# Altium schematic symbol library LATTICEPLDS_Library.SchLib: 291 symbols (part 8 of 32) (continued)
## LFE2-12/20-Q208/QN208 (continued)
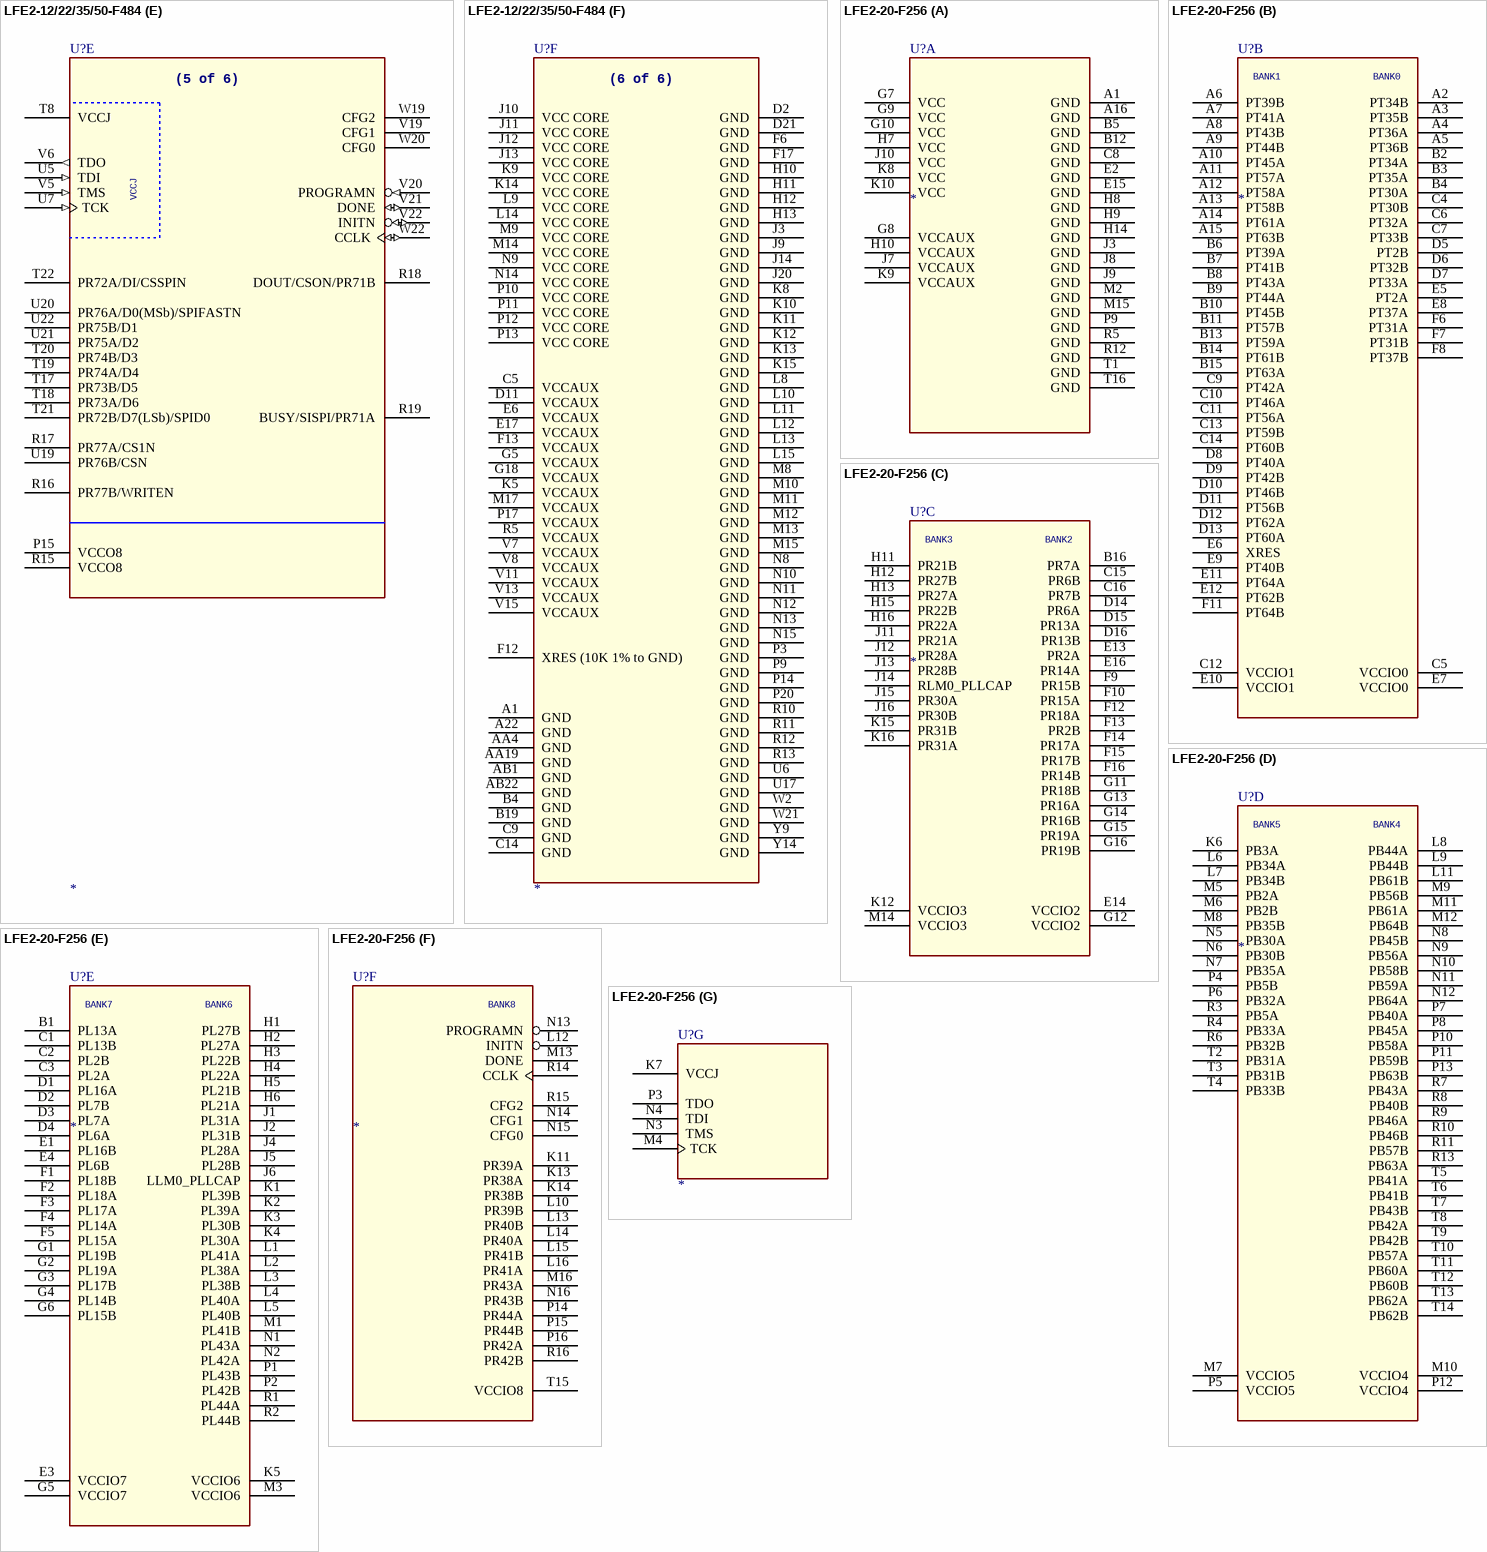
[diagram p80: symbols LFE2-12/22/35/50-F484 to LFE2-20-F256]
part A text: BANK 7; (1 OF 5); BANK 6; ** These dedicated input pins / can be used for GPLLs or GDLLs / within the respective quadrant.; Pad name = PL{LFE2-12/LFE2-20}
part B text: BANK 5; (2 OF 5); BANK 4; Pad name = PB{LFE2-12/LFE2-20}
part C text: BANK 3/8; (3 OF 5); BANK 2; ** These dedicated input pins / can be used for GPLLs or GDLLs / within the respective quadrant.; Pad name = PR{EC1/EC3/EC6}
part D text: BANK 1; (4 OF 5); BANK 0; Pad name = PT{LFE2-12/LFE2-20}
part E text: (5 OF 5); Bank 8

## LFE2-12/22/35/50-F484
designator U?
Data Sheet Rev: 1.0
footprint fpBGA484
part A pins: A2 PT12/21/21/30A, A3 PT12/21/21/30B, A4 PT13/22/22/31A, A5 PT13/22/22/31B, A6 PT21/30/30/39A, A7 PT24/33/33/42A, A8 PT24/33/33/42B, A9 PT27/36/36/45A, A10 PT27/36/36/45B, A11 PT31/40/40/49A, A12 PT31/40/40/49B, A13 PT35/44/44/53B, A14 PT39/48/48/57A, A15 PT40/49/49/58A, A16 PT44/53/53/62A, A17 PT44/53/53/62B, A18 PT49/58/67/76B, A19 PT52/61/70/79A, A20 PT50/59/68/77A, A21 PT50/59/68/77B, B1 PT5/5/5/5A, B2 PT5/5/5/5B, B3 PT10/10/10/10A, B5 PT16/25/25/34A, B6 PT16/25/25/34B, B7 PT21/30/30/39B, B8 PT23/32/32/41B, B9 PT23/32/32/41A, B10 PT28/37/37/46B/PCLKC0_0, B11 PT28/37/37/46A/PCLKT0_0, B12 PCLKC1_0/PT30/39/39/48B, B13 PT35/44/44/53A, B14 PT39/48/48/57B, B15 PT40/49/49/58B, B16 PT45/54/54/63A, B17 PT45/54/54/63B, B18 PT49/58/67/76A, B20 PT52/61/70/79B, B21 VREF2_1/PT55/64/73/82B, B22 VREF1_1/PT55/64/73/82A, C1 PT2/2/2/2A/VREF1_0, C2 PT3/3/3/3A, C3 PT10/10/10/10B, C4 PT6/6/6/6A, C6 PT17/26/26/35A, C7 PT17/26/26/35B, C8 PT20/29/29/38B, C10 PT26/35/35/44A, C11 PT26/35/35/44B, C12 PCLKT1_0/PT30/39/39/48A, C13 PT37/46/46/55A, C15 PT43/52/52/61B, C16 PT46/55/55/64A, C17 PT46/55/55/64B, C18 PT51/60/69/78A, C19 PT54/63/72/81A, C20 PT54/63/72/81B, D1 PT2/2/2/2B/VREF2_0, D3 PT3/3/3/3B, D4 PT6/6/6/6B, D5 PT7/7/7/7B, D6 PT7/7/7/7A, D7 PT9/9/9/9A, D8 PT20/29/29/38A, D9 PT15/24/24/33A, D10 PT18/27/27/36B, D12 PT33/42/42/51A, D13 PT34/43/43/52A, D14 PT37/46/46/55B, D15 PT43/52/52/61A, D16 PT47/56/65/74B, D17 PT51/60/69/78B, D18 PT53/62/71/80B, E7 PT8/8/8/8B, E8 PT11/20/20/29A, E9 PT14/23/23/32A, E10 PT18/27/27/36A, E11 PT25/34/34/43B, E12 PT33/42/42/51B, E13 PT34/43/43/52B, E14 PT36/45/45/54B, E15 PT42/51/51/60B, E16 PT47/56/65/74A, E18 PT53/62/71/80A, F7 PT8/8/8/8A, F8 PT9/9/9/9B, F9 PT14/23/23/32B, F10 PT15/24/24/33B, F11 PT25/34/34/43A, F14 PT36/45/45/54A, F15 PT42/51/51/60A, G8 PT11/20/20/29B, G9 VCCO0 (power), G10 VCCO0 (power), G11 VCCO1 (power), G12 VCCO1 (power), G13 VCCO1 (power), G14 VCCO1 (power), G15 PT48/57/66/75A, G16 PT48/57/66/75B, H7 PT4/4/4/4A, H8 VCCO0 (power), H9 VCCO0 (power), J7 PT4/4/4/4B
part B pins: C21 PRNC/4/10/12BH, C22 PRNC/4/10/12AH, D19 PR2/2/2/2BH/VREF2_2, D20 PR4/6/12/14AH, D22 PRNC/10/16/18BH, E19 PR2/2/2/2AH/VREF1_2, E20 PR4/6/12/14BH, E21 PRNC/10/16/18AH, E22 PRNC/11/17/19A, F16 PR3/5/11/13A, F18 PR3/5/11/13B, F19 PR5/7/13/15A, F20 PRNC/9/15/17A, F21 PRNC/11/17/19B, F22 PR9/15/21/40A, G17 PR5/7/13/15B, G19 PRNC/8/14/16AH/RDQS, G20 PRNC/9/15/17B, G21 PR6/12/18/37AH, G22 PR9/15/21/40B, H14 VCCO2 (power), H15 VCCO2 (power), H16 PRNC/NC/NC/26A/SPLLT_FB, H17 PRNC/NC/NC/26B/SPLLC_FB, H18 PRNC/NC/NC/25A/SPLLT_IN, H19 PRNC/8/14/16BH, H20 PRNC/NC/NC/25B/SPLLC_IN, H21 PR6/12/18/37BH, H22 PRNC/23/29/48AH, J15 VCCO2 (power), J16 PLLVCC (power), J17 PR8/14/20/39BH, J18 PR8/14/20/39AH, J19 PR7/13/19/38A, J21 PCLKT3_0/PR15/21/27/46AH, J22 PRNC/23/29/48BH, K16 VCCO2 (power), K17 PR11/17/23/42A, K18 PR10/16/22/41BH, K19 PR10/16/22/41AH/RDQS, K20 PR7/13/19/38B, K21 PCLKC3_0/PR15/21/27/46BH, K22 PRNC/24/30/49A, L16 VCCO3 (power), L17 PR13/19/25/44A/PCLKT2_0, L18 PR11/17/23/42B, L19 PR12/18/24/43BH, L20 PR12/18/24/43AH, L21 VREF1_3/PR16/22/28/47A, L22 PRNC/24/30/49B, M16 VCCO3 (power), M18 PR13/19/25/44B/PCLKC2_0, M19 PRNC/26/40/59A, M20 VREF2_3/PR16/22/28/47B, M21 GDLLT_IN/PR17/27/41/60AH, M22 GDLLC_IN/PR17/27/41/60BH, N16 VCCO3 (power), N17 PLLCAP (power), N18 PLLVCC (power), N19 PRNC/26/40/59B, N20 GDLLT_FB/PR18/28/42/61A, N21 GPLLT_IN/PR20/30/44/63AH, N22 GDLLC_FB/PR18/28/42/61B, P16 VCCO3 (power), P18 PR22/32/46/65BH, P19 PR22/32/46/65AH, P21 GPLLC_IN/PR20/30/44/63BH, P22 GPLLT_FB/PR21/31/45/64A, R20 GPLLC_FB/PR21/31/45/64B, R21 PR23/33/47/66A, R22 PR23/33/47/66B
part C pins: AA3 PB6/6/6/6B, AA5 PB8/8/8/8A, AA6 PB9/9/9/9B, AA7 PB13/22/22/31A, AA8 PB16/25/25/34B, AA9 PB18/27/27/36B, AA10 PB21/30/30/39B, AA11 PB23/32/32/41B, AA12 PB25/34/34/43B, AA13 BDQS/PB33/42/42/51A, AA14 PB35/44/44/53B, AA15 PB41/50/50/59B, AA16 BDQS/PB42/51/51/60A, AA17 PB42/51/51/60B, AA18 PB46/55/55/64A, AA20 PB46/55/55/64B, AA21 PB48/57/66/75A, AA22 PB48/57/66/75B, AB2 PB5/5/5/5B, AB3 PB5/5/5/5A, AB4 PB7/7/7/7B, AB5 PB7/7/7/7A, AB6 PB9/9/9/9A, AB7 PB13/22/22/31B, AB8 PB18/27/27/36A, AB9 PB20/29/29/38A, AB10 PB20/29/29/38B, AB11 PB23/32/32/41A, AB12 PB25/34/34/43A, AB13 PB26/35/35/44A/PCLKT5_0, AB14 PB26/35/35/44B/PCLKC5_0, AB15 PB35/44/44/53A, AB16 PB36/45/45/54A, AB17 PB36/45/45/54B, AB18 PB39/48/48/57A, AB19 PB39/48/48/57B, AB20 PB43/52/52/61A, AB21 PB43/52/52/61B, R9 VCCO5 (power), R14 VCCO4 (power), T9 VCCO5 (power), T10 VCCO5 (power), T11 VCCO5 (power), T12 VCCO4 (power), T13 VCCO4 (power), T14 VCCO4 (power), T15 VREF2_4/PB55/64/73/82A, T16 VREF1_4/PB55/64/73/82B, U8 PB14/23/23/32A, U9 PB14/23/23/32B, U10 PB22/31/31/40A, U11 PB22/31/31/40B, U12 PCLKT4_0/PB31/40/40/49A, U13 PB34/43/43/52A, U14 PB34/43/43/52B, U15 PB44/53/53/62A, U16 PB44/53/53/62B, U18 PB54/63/72/81A, V9 PB15/24/24/33B, V10 PB17/26/26/35B, V12 PCLKC4_0/PB31/40/40/49B, V14 PB40/49/49/58A, V16 PB49/58/67/76A, V17 PB49/58/67/76B, V18 PB54/63/72/81B, W3 PB3/3/3/3B, W4 PB3/3/3/3A, W5 PB4/4/4/4A, W6 PB4/4/4/4B, W7 PB11/20/20/29A, W8 PB11/20/20/29B, W9 PB15/24/24/33A/BDQS, W10 PB17/26/26/35A, W11 PB24/33/33/42B, W12 PB32/41/41/50B, W13 PB37/46/46/55A, W14 PB37/46/46/55B, W15 PB40/49/49/58B, W16 PB45/54/54/63B, W17 PB52/61/70/79A, W18 PB52/61/70/79B, Y2 PB2/2/2/2B/VREF1_5, Y3 PB2/2/2/2A/VREF2_5, Y4 PB6/6/6/6A/BDQS, Y5 PB8/8/8/8B, Y6 PB12/21/21/30A, Y7 PB12/21/21/30B, Y8 PB16/25/25/34A, Y10 PB21/30/30/39A, Y11 PB24/33/33/42A/BDQS, Y12 PB32/41/41/50A, Y13 PB33/42/42/51B, Y15 PB41/50/50/59A, Y16 PB45/54/54/63A, Y17 PB50/59/68/77B, Y18 PB50/59/68/77A, Y19 BDQS/PB51/60/69/78A, Y20 PB51/60/69/78B, Y21 PB53/62/71/80A, Y22 PB53/62/71/80B
part D pins: AA1 PL31/45/59/78B, AA2 PL31/45/59/78A, E1 PL4/6/12/14BH, E2 PL4/6/12/14AH, E3 PLNC/4/10/12AH, E4 PL2/2/2/2/2AH/VREF2_7, E5 PL2/2/2/2/2BH/VREF1_7, F1 PLNC/9/15/17A, F2 PLNC/9/15/17B, F3 PLNC/4/10/12BH, F4 PL3/5/11/13A, F5 PL3/5/11/13B, G1 PLNC/11/17/19A, G2 PLNC/11/17/19B, G3 PLNC/10/16/18AH, G4 PLNC/10/16/18BH, G6 PL5/7/13/15A, G7 PL5/7/13/15B, H1 PL6/12/18/37A, H2 PLNC/NC/NC/26B/SPLLC_FB, H3 PLNC/NC/NC/26A/SPLLT_FB, H4 PLNC/8/14/16AH/LDQS, H5 PLNC/8/14/16BH, H6 PLNC/NC/NC/25A/SPLLT_IN, J1 PL8/14/20/39BH, J2 PL8/14/20/39AH, J4 PL7/13/19/38A, J5 PL7/13/19/38B, J6 PLNC/NC/NC/25B/SPLLC_IN, J8 VCCO7 (power), K1 PL11/17/23/42B, K2 PL11/17/23/42A, K3 PL10/16/22/41AH/LDQS, K4 PL10/16/22/41BH, K6 PLLVCC (power), K7 VCCO7 (power), L1 PL13/19/25/44B/PCLKC7_0, L2 PL13/19/25/44A/PCLKT7_0, L3 PL12/18/24/43BH, L4 PL12/18/24/43AH, L5 PL9/15/21/40B, L6 PL9/15/21/40A, L7 VCCO7 (power), M1 PLNC/23/29/48BH, M2 PLNC/23/29/48AH, M3 VREF2_6/PL16/22/28/47A, M4 VREF1_6/PL16/22/28/47B, M5 PCLKT6_0/PL15/21/27/46AH, M6 PCLKC6_0/PL15/21/27/46BH, M7 VCCO7 (power), N1 PLNC/24/30/49A, N2 PLNC/24/30/49B, N3 LDQS/PLNC/25/39/58AH, N4 PLNC/25/39/58BH, N5 PLNC/26/40/59A, N6 PLLVCC (power), N7 VCCO6 (power), P1 GDLLT_IN/PL17/27/41/60AH, P2 GDLLC_IN/PL17/27/41/60BH, P4 GDLLT_FB/PL18/28/42/61A, P5 PLNC/26/40/59B, P6 PLLCAP (power), P7 VCCO6 (power), P8 VCCO6 (power), R1 GPLLT_IN/PL20/30/44/63AH, R2 GPLLC_IN/PL20/30/44/63BH, R3 GPLLT_FB/PL21/31/45/64A, R4 GDLLC_FB/PL18/28/42/61B, R6 PL26/40/54/73AH, R7 PL29/43/57/76A, R8 VCCO6 (power), T1 PL22/32/46/65AH, T2 PL22/32/46/65BH, T3 PL23/33/47/66B, T4 GPLLC_FB/PL21/31/45/64B, T5 PL23/33/47/66A, T6 PL26/40/54/73BH, T7 PL29/43/57/76B, U1 PL24/38/52/71AH, U2 PL24/38/52/71BH, U3 PL27/41/55/74A, U4 PL27/41/55/74B, V1 PL25/39/53/72A, V2 PL25/39/53/72B, V3 PL30/44/58/77BH, V4 PL30/44/58/77AH, W1 PL28/42/56/75BH, Y1 LDQS/PL28/42/56/75AH
part E pins: P15 VCCO8 (power), R15 VCCO8 (power), R16 PR77B/WRITEN, R17 PR77A/CS1N, R18 DOUT/CSON/PR71B, R19 BUSY/SISPI/PR71A, T8 VCCJ (power), T17 PR73B/D5, T18 PR73A/D6, T19 PR74A/D4, T20 PR74B/D3, T21 PR72B/D7(LSb)/SPID0, T22 PR72A/DI/CSSPIN, U5 TDI (in), U7 TCK (in), U19 PR76B/CSN, U20 PR76A/D0(MSb)/SPIFASTN, U21 PR75A/D2, U22 PR75B/D1, V5 TMS (in), V6 TDO (out), V19 CFG1, V20 PROGRAMN (in), V21 DONE (io), V22 INITN (io), W19 CFG2, W20 CFG0, W22 CCLK (io)
part F pins: A1 GND (power), A22 GND (power), AA4 GND (power), AA19 GND (power), AB1 GND (power), AB22 GND (power), B4 GND (power), B19 GND (power), C5 VCCAUX (power), C9 GND (power), C14 GND (power), D2 GND (power), D11 VCCAUX (power), D21 GND (power), E6 VCCAUX (power), E17 VCCAUX (power), F6 GND (power), F12 XRES (10K 1% to GND), F13 VCCAUX (power), F17 GND (power), G5 VCCAUX (power), G18 VCCAUX (power), H10 GND (power), H11 GND (power), H12 GND (power), H13 GND (power), J3 GND (power), J9 GND (power), J10 VCC CORE (power), J11 VCC CORE (power), J12 VCC CORE (power), J13 VCC CORE (power), J14 GND (power), J20 GND (power), K5 VCCAUX (power), K8 GND (power), K9 VCC CORE (power), K10 GND (power), K11 GND (power), K12 GND (power), K13 GND (power), K14 VCC CORE (power), K15 GND (power), L8 GND (power), L9 VCC CORE (power), L10 GND (power), L11 GND (power), L12 GND (power), L13 GND (power), L14 VCC CORE (power), L15 GND (power), M8 GND (power), M9 VCC CORE (power), M10 GND (power), M11 GND (power), M12 GND (power), M13 GND (power), M14 VCC CORE (power), M15 GND (power), M17 VCCAUX (power), N8 GND (power), N9 VCC CORE (power), N10 GND (power), N11 GND (power), N12 GND (power), N13 GND (power), N14 VCC CORE (power), N15 GND (power), P3 GND (power), P9 GND (power), P10 VCC CORE (power), P11 VCC CORE (power), P12 VCC CORE (power), P13 VCC CORE (power), P14 GND (power), P17 VCCAUX (power), P20 GND (power), R5 VCCAUX (power), R10 GND (power), R11 GND (power), R12 GND (power), R13 GND (power), U6 GND (power), U17 GND (power), V7 VCCAUX (power), V8 VCCAUX (power), V11 VCCAUX (power), V13 VCCAUX (power), V15 VCCAUX (power), W2 GND (power), W21 GND (power), Y9 GND (power), Y14 GND (power)
part A text: BANK0; (1 of 6); BANK1; Pad Name = PT{12/22/35/50}
part B text: BANK2; (2 of 6); BANK3; DQS Group; Pad Name = PR{12/22/35/50}; PRnnxH = True LVDS
part C text: BANK5; (3 of 6); BANK4; DQS Group; Pad Name = PB{12/22/35/50}
part D text: BANK7; (4 of 6); BANK6; DQS Group; Pad Name = PL{12/22/35/50}; PLnnxH = True LVDS
part E text: (5 of 6)
part F text: (6 of 6)

## LFE2-20-F256
designator U?
SPLIT_INST: TRUE; SWAP_INFO: (S1+S2+S3+S4+S5+S6+S7)
part A pins: A1 GND (power), A16 GND (power), B5 GND (power), B12 GND (power), C8 GND (power), E2 GND (power), E15 GND (power), G7 VCC (power), G8 VCCAUX (power), G9 VCC (power), G10 VCC (power), H7 VCC (power), H8 GND (power), H9 GND (power), H10 VCCAUX (power), H14 GND (power), J3 GND (power), J7 VCCAUX (power), J8 GND (power), J9 GND (power), J10 VCC (power), K8 VCC (power), K9 VCCAUX (power), K10 VCC (power), M2 GND (power), M15 GND (power), P9 GND (power), R5 GND (power), R12 GND (power), T1 GND (power), T16 GND (power)
part B pins: A2 PT34B, A3 PT35B, A4 PT36A, A5 PT36B, A6 PT39B, A7 PT41A, A8 PT43B, A9 PT44B, A10 PT45A, A11 PT57A, A12 PT58A, A13 PT58B, A14 PT61A, A15 PT63B, B2 PT34A, B3 PT35A, B4 PT30A, B6 PT39A, B7 PT41B, B8 PT43A, B9 PT44A, B10 PT45B, B11 PT57B, B13 PT59A, B14 PT61B, B15 PT63A, C4 PT30B, C5 VCCIO0 (power), C6 PT32A, C7 PT33B, C9 PT42A, C10 PT46A, C11 PT56A, C12 VCCIO1 (power), C13 PT59B, C14 PT60B, D5 PT2B, D6 PT32B, D7 PT33A, D8 PT40A, D9 PT42B, D10 PT46B, D11 PT56B, D12 PT62A, D13 PT60A, E5 PT2A, E6 XRES, E7 VCCIO0 (power), E8 PT37A, E9 PT40B, E10 VCCIO1 (power), E11 PT64A, E12 PT62B, F6 PT31A, F7 PT31B, F8 PT37B, F11 PT64B
part C pins: B16 PR7A, C15 PR6B, C16 PR7B, D14 PR6A, D15 PR13A, D16 PR13B, E13 PR2A, E14 VCCIO2 (power), E16 PR14A, F9 PR15B, F10 PR15A, F12 PR18A, F13 PR2B, F14 PR17A, F15 PR17B, F16 PR14B, G11 PR18B, G12 VCCIO2 (power), G13 PR16A, G14 PR16B, G15 PR19A, G16 PR19B, H11 PR21B, H12 PR27B, H13 PR27A, H15 PR22B, H16 PR22A, J11 PR21A, J12 PR28A, J13 PR28B, J14 RLM0_PLLCAP, J15 PR30A, J16 PR30B, K12 VCCIO3 (power), K15 PR31B, K16 PR31A, M14 VCCIO3 (power)
part D pins: K6 PB3A, L6 PB34A, L7 PB34B, L8 PB44A, L9 PB44B, L11 PB61B, M5 PB2A, M6 PB2B, M7 VCCIO5 (power), M8 PB35B, M9 PB56B, M10 VCCIO4 (power), M11 PB61A, M12 PB64B, N5 PB30A, N6 PB30B, N7 PB35A, N8 PB45B, N9 PB56A, N10 PB58B, N11 PB59A, N12 PB64A, P4 PB5B, P5 VCCIO5 (power), P6 PB32A, P7 PB40A, P8 PB45A, P10 PB58A, P11 PB59B, P12 VCCIO4 (power), P13 PB63B, R3 PB5A, R4 PB33A, R6 PB32B, R7 PB43A, R8 PB40B, R9 PB46A, R10 PB46B, R11 PB57B, R13 PB63A, T2 PB31A, T3 PB31B, T4 PB33B, T5 PB41A, T6 PB41B, T7 PB43B, T8 PB42A, T9 PB42B, T10 PB57A, T11 PB60A, T12 PB60B, T13 PB62A, T14 PB62B
part E pins: B1 PL13A, C1 PL13B, C2 PL2B, C3 PL2A, D1 PL16A, D2 PL7B, D3 PL7A, D4 PL6A, E1 PL16B, E3 VCCIO7 (power), E4 PL6B, F1 PL18B, F2 PL18A, F3 PL17A, F4 PL14A, F5 PL15A, G1 PL19B, G2 PL19A, G3 PL17B, G4 PL14B, G5 VCCIO7 (power), G6 PL15B, H1 PL27B, H2 PL27A, H3 PL22B, H4 PL22A, H5 PL21B, H6 PL21A, J1 PL31A, J2 PL31B, J4 PL28A, J5 PL28B, J6 LLM0_PLLCAP, K1 PL39B, K2 PL39A, K3 PL30B, K4 PL30A, K5 VCCIO6 (power), L1 PL41A, L2 PL38A, L3 PL38B, L4 PL40A, L5 PL40B, M1 PL41B, M3 VCCIO6 (power), N1 PL43A, N2 PL42A, P1 PL43B, P2 PL42B, R1 PL44A, R2 PL44B
part F pins: K11 PR39A, K13 PR38A, K14 PR38B, L10 PR39B, L12 INITN, L13 PR40B, L14 PR40A, L15 PR41B, L16 PR41A, M13 DONE, M16 PR43A, N13 PROGRAMN, N14 CFG1, N15 CFG0, N16 PR43B, P14 PR44A, P15 PR44B, P16 PR42A, R14 CCLK, R15 CFG2, R16 PR42B, T15 VCCIO8 (power)
part G pins: K7 VCCJ (power), M4 TCK, N3 TMS, N4 TDI, P3 TDO
part B text: BANK1; BANK0
part C text: BANK3; BANK2
part D text: BANK5; BANK4
part E text: BANK7; BANK6
part F text: BANK8

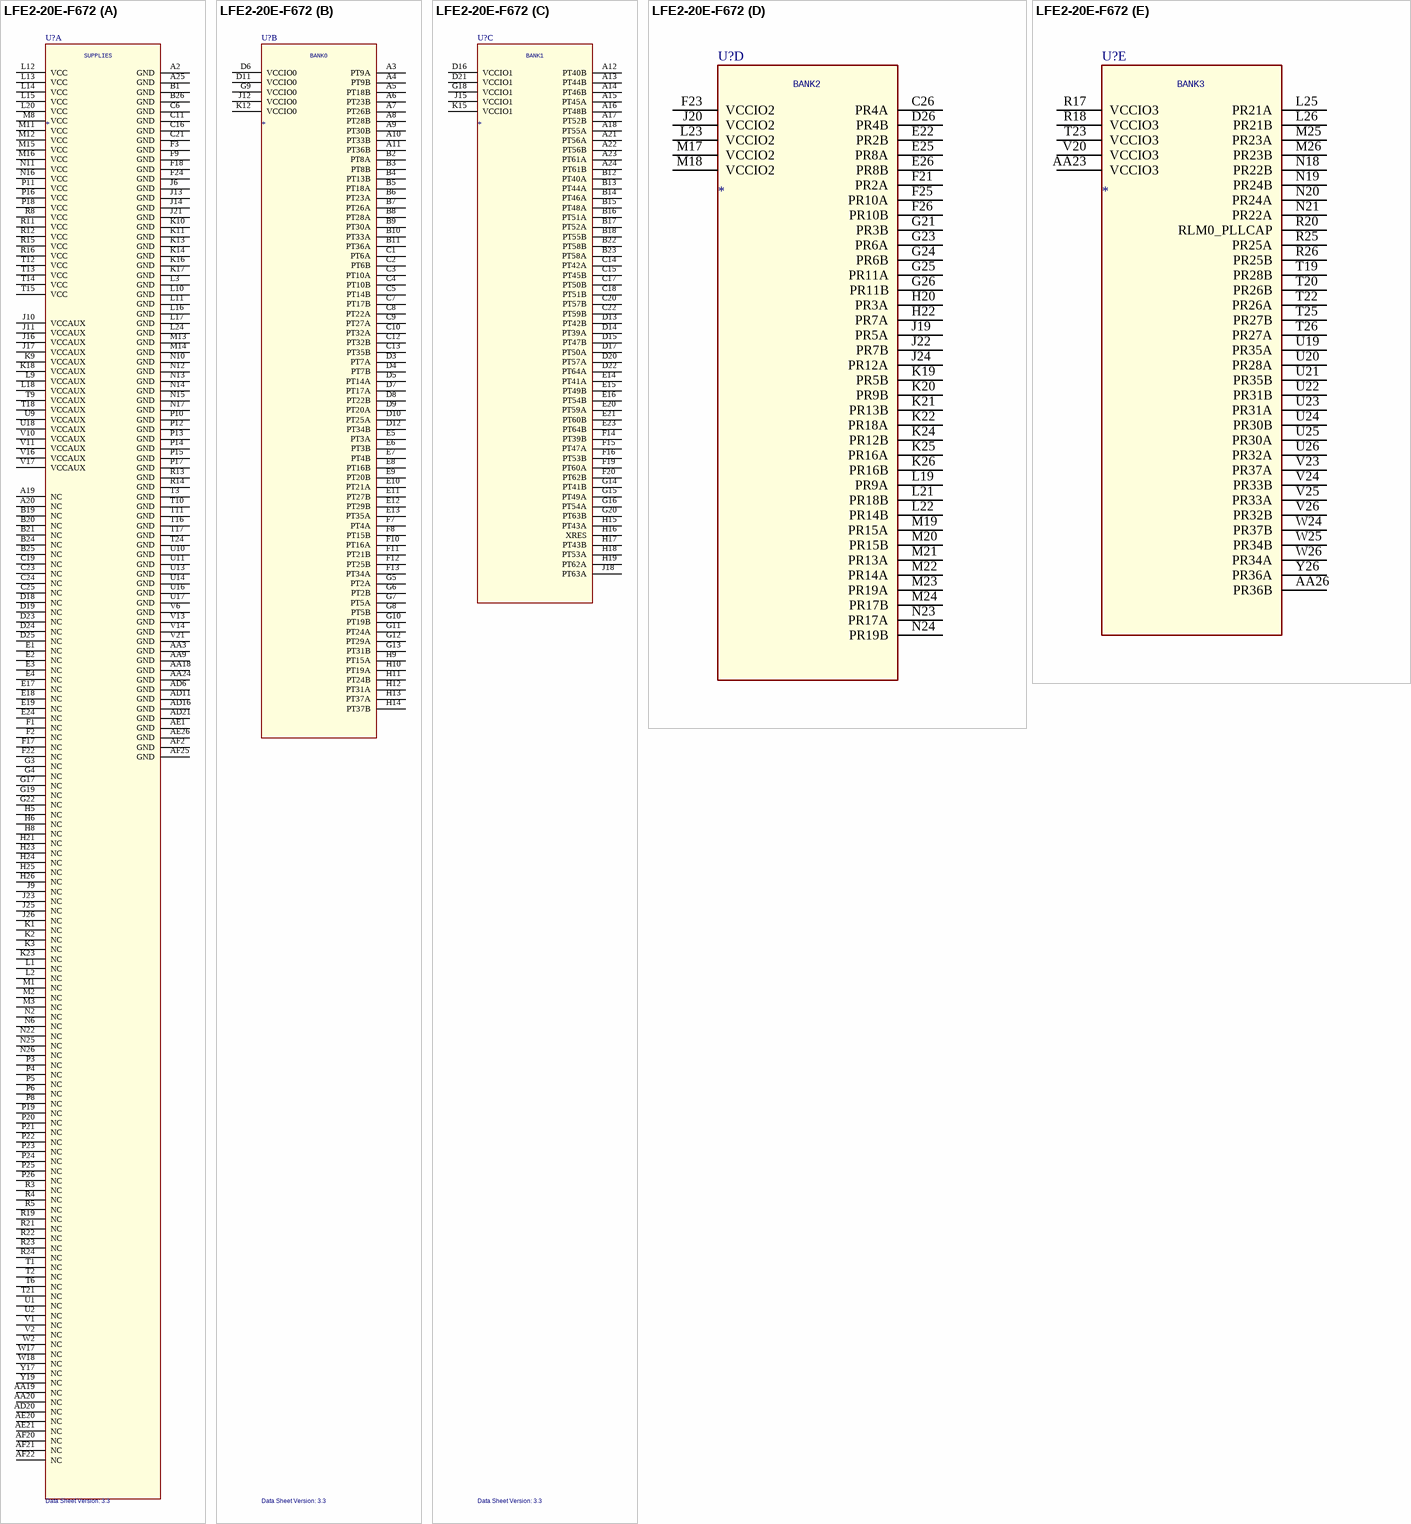
[diagram p81: symbol LFE2-20E-F672]

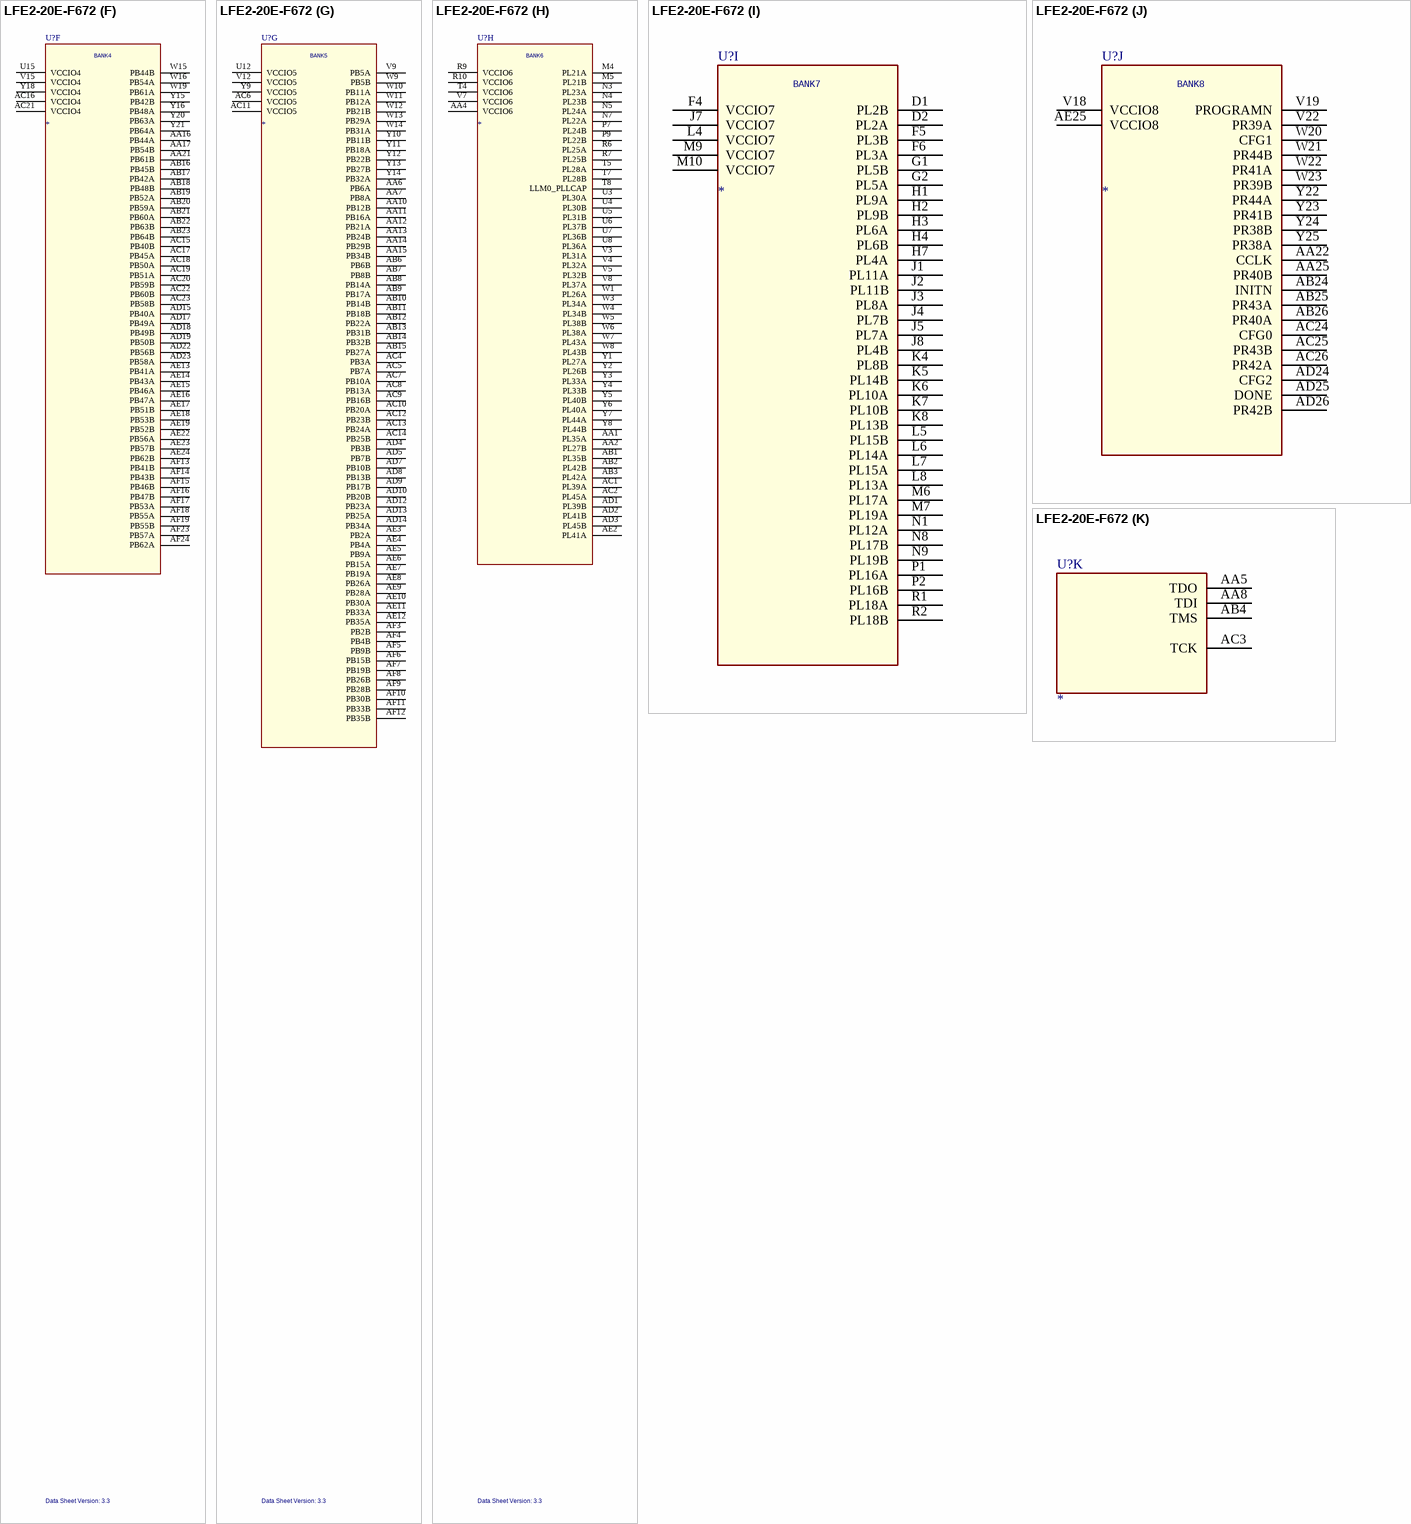
[diagram p82: symbol LFE2-20E-F672]

## LFE2-20E-F672
designator U?  Data Sheet Version: 3.3
SWAP_INFO: (S1+S2+S3+S4+S5+S6+S7+S8+S9+S10+S11); SPLIT_INST: TRUE
part A pins: A2 GND (power), A19 NC, A20 NC, A25 GND (power), AA3 GND (power), AA9 GND (power), AA18 GND (power), AA19 NC, AA20 NC, AA24 GND (power), AD6 GND (power), AD11 GND (power), AD16 GND (power), AD20 NC, AD21 GND (power), AE1 GND (power), AE20 NC, AE21 NC, AE26 GND (power), AF2 GND (power), AF20 NC, AF21 NC, AF22 NC, AF25 GND (power), B1 GND (power), B19 NC, B20 NC, B21 NC, B24 NC, B25 NC, B26 GND (power), C6 GND (power), C11 GND (power), C16 GND (power), C19 NC, C21 GND (power), C23 NC, C24 NC, C25 NC, D18 NC, D19 NC, D23 NC, D24 NC, D25 NC, E1 NC, E2 NC, E3 NC, E4 NC, E17 NC, E18 NC, E19 NC, E24 NC, F1 NC, F2 NC, F3 GND (power), F9 GND (power), F17 NC, F18 GND (power), F22 NC, F24 GND (power), G3 NC, G4 NC, G17 NC, G19 NC, G22 NC, H5 NC, H6 NC, H8 NC, H21 NC, H23 NC, H24 NC, H25 NC, H26 NC, J6 GND (power), J9 NC, J10 VCCAUX (power), J11 VCCAUX (power), J13 GND (power), J14 GND (power), J16 VCCAUX (power), J17 VCCAUX (power), J21 GND (power), J23 NC, J25 NC, J26 NC, K1 NC, K2 NC, K3 NC, K9 VCCAUX (power), K10 GND (power), K11 GND (power), K13 GND (power), K14 GND (power), K16 GND (power), K17 GND (power), K18 VCCAUX (power), K23 NC, L1 NC, L2 NC, L3 GND (power), L9 VCCAUX (power), L10 GND (power), L11 GND (power), L12 VCC (power), L13 VCC (power), L14 VCC (power), L15 VCC (power), L16 GND (power), L17 GND (power), L18 VCCAUX (power), L20 VCC (power), L24 GND (power), M1 NC, M2 NC, M3 NC, M8 VCC (power), M11 VCC (power), M12 VCC (power), M13 GND (power), M14 GND (power), M15 VCC (power), M16 VCC (power), N2 NC, N6 NC, N10 GND (power), N11 VCC (power), N12 GND (power), N13 GND (power), N14 GND (power), N15 GND (power), N16 VCC (power), N17 GND (power), N22 NC, N25 NC, N26 NC, P3 NC, P4 NC, P5 NC, P6 NC, P8 NC, P10 GND (power), P11 VCC (power), P12 GND (power), P13 GND (power), P14 GND (power), P15 GND (power), P16 VCC (power), P17 GND (power), P18 VCC (power), P19 NC, P20 NC, P21 NC, P22 NC, P23 NC, P24 NC, P25 NC, P26 NC, R3 NC, R4 NC, R5 NC, R8 VCC (power), R11 VCC (power), R12 VCC (power), R13 GND (power), R14 GND (power), R15 VCC (power), R16 VCC (power), R19 NC, R21 NC, R22 NC, R23 NC, R24 NC, T1 NC, T2 NC, T3 GND (power), T6 NC, T9 VCCAUX (power), T10 GND (power), T11 GND (power), T12 VCC (power), T13 VCC (power), T14 VCC (power), T15 VCC (power), T16 GND (power), T17 GND (power), T18 VCCAUX (power), T21 NC, T24 GND (power), U1 NC, U2 NC, U9 VCCAUX (power), U10 GND (power), U11 GND (power), U13 GND (power), U14 GND (power), U16 GND (power), U17 GND (power), U18 VCCAUX (power), V1 NC, V2 NC, V6 GND (power), V10 VCCAUX (power), V11 VCCAUX (power), V13 GND (power), V14 GND (power), V16 VCCAUX (power), V17 VCCAUX (power), V21 GND (power), W2 NC, W17 NC, W18 NC, Y17 NC, Y19 NC
part B pins: A3 PT9A, A4 PT9B, A5 PT18B, A6 PT23B, A7 PT26B, A8 PT28B, A9 PT30B, A10 PT33B, A11 PT36B, B2 PT8A, B3 PT8B, B4 PT13B, B5 PT18A, B6 PT23A, B7 PT26A, B8 PT28A, B9 PT30A, B10 PT33A, B11 PT36A, C1 PT6A, C2 PT6B, C3 PT10A, C4 PT10B, C5 PT14B, C7 PT17B, C8 PT22A, C9 PT27A, C10 PT32A, C12 PT32B, C13 PT35B, D3 PT7A, D4 PT7B, D5 PT14A, D6 VCCIO0 (power), D7 PT17A, D8 PT22B, D9 PT20A, D10 PT25A, D11 VCCIO0 (power), D12 PT34B, E5 PT3A, E6 PT3B, E7 PT4B, E8 PT16B, E9 PT20B, E10 PT21A, E11 PT27B, E12 PT29B, E13 PT35A, F7 PT4A, F8 PT15B, F10 PT16A, F11 PT21B, F12 PT25B, F13 PT34A, G5 PT2A, G6 PT2B, G7 PT5A, G8 PT5B, G9 VCCIO0 (power), G10 PT19B, G11 PT24A, G12 PT29A, G13 PT31B, H9 PT15A, H10 PT19A, H11 PT24B, H12 PT31A, H13 PT37A, H14 PT37B, J12 VCCIO0 (power), K12 VCCIO0 (power)
part C pins: A12 PT40B, A13 PT44B, A14 PT46B, A15 PT45A, A16 PT48B, A17 PT52B, A18 PT55A, A21 PT56A, A22 PT56B, A23 PT61A, A24 PT61B, B12 PT40A, B13 PT44A, B14 PT46A, B15 PT48A, B16 PT51A, B17 PT52A, B18 PT55B, B22 PT58B, B23 PT58A, C14 PT42A, C15 PT45B, C17 PT50B, C18 PT51B, C20 PT57B, C22 PT59B, D13 PT42B, D14 PT39A, D15 PT47B, D16 VCCIO1 (power), D17 PT50A, D20 PT57A, D21 VCCIO1 (power), D22 PT64A, E14 PT41A, E15 PT49B, E16 PT54B, E20 PT59A, E21 PT60B, E23 PT64B, F14 PT39B, F15 PT47A, F16 PT53B, F19 PT60A, F20 PT62B, G14 PT41B, G15 PT49A, G16 PT54A, G18 VCCIO1 (power), G20 PT63B, H15 PT43A, H16 XRES, H17 PT43B, H18 PT53A, H19 PT62A, J15 VCCIO1 (power), J18 PT63A, K15 VCCIO1 (power)
part D pins: C26 PR4A, D26 PR4B, E22 PR2B, E25 PR8A, E26 PR8B, F21 PR2A, F23 VCCIO2 (power), F25 PR10A, F26 PR10B, G21 PR3B, G23 PR6A, G24 PR6B, G25 PR11A, G26 PR11B, H20 PR3A, H22 PR7A, J19 PR5A, J20 VCCIO2 (power), J22 PR7B, J24 PR12A, K19 PR5B, K20 PR9B, K21 PR13B, K22 PR18A, K24 PR12B, K25 PR16A, K26 PR16B, L19 PR9A, L21 PR18B, L22 PR14B, L23 VCCIO2 (power), M17 VCCIO2 (power), M18 VCCIO2 (power), M19 PR15A, M20 PR15B, M21 PR13A, M22 PR14A, M23 PR19A, M24 PR17B, N23 PR17A, N24 PR19B
part E pins: AA23 VCCIO3 (power), AA26 PR36B, L25 PR21A, L26 PR21B, M25 PR23A, M26 PR23B, N18 PR22B, N19 PR24B, N20 PR24A, N21 PR22A, R17 VCCIO3 (power), R18 VCCIO3 (power), R20 RLM0_PLLCAP, R25 PR25A, R26 PR25B, T19 PR28B, T20 PR26B, T22 PR26A, T23 VCCIO3 (power), T25 PR27B, T26 PR27A, U19 PR35A, U20 PR28A, U21 PR35B, U22 PR31B, U23 PR31A, U24 PR30B, U25 PR30A, U26 PR32A, V20 VCCIO3 (power), V23 PR37A, V24 PR33B, V25 PR33A, V26 PR32B, W24 PR37B, W25 PR34B, W26 PR34A, Y26 PR36A
part F pins: AA16 PB44A, AA17 PB54B, AA21 PB61B, AB16 PB45B, AB17 PB42A, AB18 PB48B, AB19 PB52A, AB20 PB59A, AB21 PB60A, AB22 PB63B, AB23 PB64B, AC15 PB40B, AC16 VCCIO4 (power), AC17 PB45A, AC18 PB50A, AC19 PB51A, AC20 PB59B, AC21 VCCIO4 (power), AC22 PB60B, AC23 PB58B, AD15 PB40A, AD17 PB49A, AD18 PB49B, AD19 PB50B, AD22 PB56B, AD23 PB58A, AE13 PB41A, AE14 PB43A, AE15 PB46A, AE16 PB47A, AE17 PB51B, AE18 PB53B, AE19 PB52B, AE22 PB56A, AE23 PB57B, AE24 PB62B, AF13 PB41B, AF14 PB43B, AF15 PB46B, AF16 PB47B, AF17 PB53A, AF18 PB55A, AF19 PB55B, AF23 PB57A, AF24 PB62A, U15 VCCIO4 (power), V15 VCCIO4 (power), W15 PB44B, W16 PB54A, W19 PB61A, Y15 PB42B, Y16 PB48A, Y18 VCCIO4 (power), Y20 PB63A, Y21 PB64A
part G pins: AA6 PB6A, AA7 PB8A, AA10 PB12B, AA11 PB16A, AA12 PB21A, AA13 PB24B, AA14 PB29B, AA15 PB34B, AB6 PB6B, AB7 PB8B, AB8 PB14A, AB9 PB17A, AB10 PB14B, AB11 PB18B, AB12 PB22A, AB13 PB31B, AB14 PB32B, AB15 PB27A, AC4 PB3A, AC5 PB7A, AC6 VCCIO5 (power), AC7 PB10A, AC8 PB13A, AC9 PB16B, AC10 PB20A, AC11 VCCIO5 (power), AC12 PB23B, AC13 PB24A, AC14 PB25B, AD4 PB3B, AD5 PB7B, AD7 PB10B, AD8 PB13B, AD9 PB17B, AD10 PB20B, AD12 PB23A, AD13 PB25A, AD14 PB34A, AE3 PB2A, AE4 PB4A, AE5 PB9A, AE6 PB15A, AE7 PB19A, AE8 PB26A, AE9 PB28A, AE10 PB30A, AE11 PB33A, AE12 PB35A, AF3 PB2B, AF4 PB4B, AF5 PB9B, AF6 PB15B, AF7 PB19B, AF8 PB26B, AF9 PB28B, AF10 PB30B, AF11 PB33B, AF12 PB35B, U12 VCCIO5 (power), V9 PB5A, V12 VCCIO5 (power), W9 PB5B, W10 PB11A, W11 PB12A, W12 PB21B, W13 PB29A, W14 PB31A, Y9 VCCIO5 (power), Y10 PB11B, Y11 PB18A, Y12 PB22B, Y13 PB27B, Y14 PB32A
part H pins: AA1 PL35A, AA2 PL27B, AA4 VCCIO6 (power), AB1 PL35B, AB2 PL42B, AB3 PL42A, AC1 PL39A, AC2 PL45A, AD1 PL39B, AD2 PL41B, AD3 PL45B, AE2 PL41A, M4 PL21A, M5 PL21B, N3 PL23A, N4 PL23B, N5 PL24A, N7 PL22A, P7 PL24B, P9 PL22B, R6 PL25A, R7 PL25B, R9 VCCIO6 (power), R10 VCCIO6 (power), T4 VCCIO6 (power), T5 PL28A, T7 PL28B, T8 LLM0_PLLCAP, U3 PL30A, U4 PL30B, U5 PL31B, U6 PL37B, U7 PL36B, U8 PL36A, V3 PL31A, V4 PL32A, V5 PL32B, V7 VCCIO6 (power), V8 PL37A, W1 PL26A, W3 PL34A, W4 PL34B, W5 PL38B, W6 PL38A, W7 PL43A, W8 PL43B, Y1 PL27A, Y2 PL26B, Y3 PL33A, Y4 PL33B, Y5 PL40B, Y6 PL40A, Y7 PL44A, Y8 PL44B
part I pins: D1 PL2B, D2 PL2A, F4 VCCIO7 (power), F5 PL3B, F6 PL3A, G1 PL5B, G2 PL5A, H1 PL9A, H2 PL9B, H3 PL6A, H4 PL6B, H7 PL4A, J1 PL11A, J2 PL11B, J3 PL8A, J4 PL7B, J5 PL7A, J7 VCCIO7 (power), J8 PL4B, K4 PL8B, K5 PL14B, K6 PL10A, K7 PL10B, K8 PL13B, L4 VCCIO7 (power), L5 PL15B, L6 PL14A, L7 PL15A, L8 PL13A, M6 PL17A, M7 PL19A, M9 VCCIO7 (power), M10 VCCIO7 (power), N1 PL12A, N8 PL17B, N9 PL19B, P1 PL16A, P2 PL16B, R1 PL18A, R2 PL18B
part J pins: AA22 CCLK, AA25 PR40B, AB24 INITN, AB25 PR43A, AB26 PR40A, AC24 CFG0, AC25 PR43B, AC26 PR42A, AD24 CFG2, AD25 DONE, AD26 PR42B, AE25 VCCIO8 (power), V18 VCCIO8 (power), V19 PROGRAMN, V22 PR39A, W20 CFG1, W21 PR44B, W22 PR41A, W23 PR39B, Y22 PR44A, Y23 PR41B, Y24 PR38B, Y25 PR38A
part K pins: AA5 TDO, AA8 TDI, AB4 TMS, AB5 VCCJ (power) hidden, AC3 TCK
